# Altium footprint library RPSLib.PcbLib: 199 footprints (part 9 of 13)
Each footprint in its own frame and in the unit in brackets; x right, y up, seen from the top. Pads: shape width x height; smd on the part's side, far side on the other; paste and mask are expansions set on the pad; w line width, h text height; cw(c..) or ccw(c..) is an arc to the next point about the centre after c.
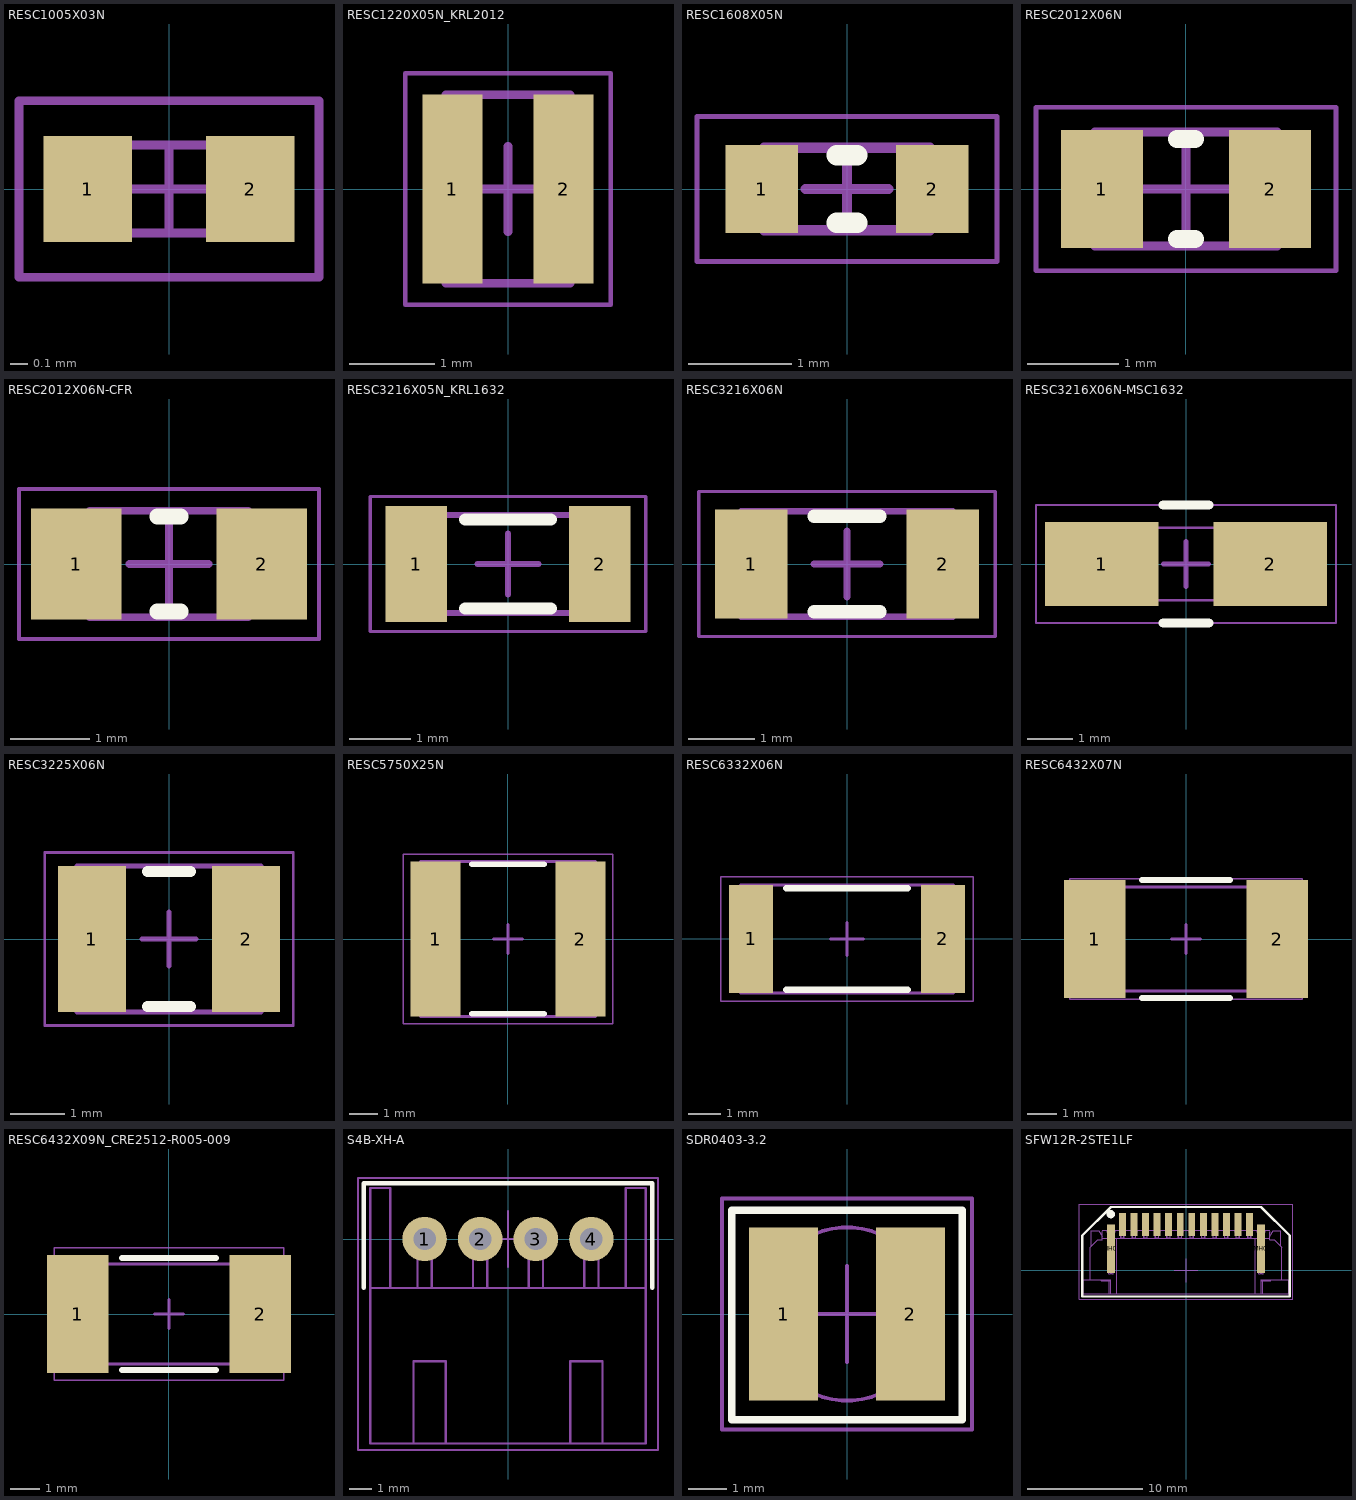
[diagram p8: the footprints below, top view; thin cyan lines are the x and y axes]

## RESC1005X03N [mm] "Chip Resistor, 2-Leads, Body 1.00x0.50mm, IPC Medium Density"
height 0.35
pads (2):
  rect 0.5x0.6 smd paste-0.03 mask+0.07: 1(-0.46,0) 2(0.46,0)
Mechanical 13:
  lines w0.05: -0.5,-0.25 -0.5,0.25 0.5,0.25 0.5,-0.25 -0.5,-0.25
Mechanical 15:
  lines w0.05: -0.25,0 0.25,0 ; 0,-0.25 0,0.25 ; -0.85,-0.5 -0.85,0.5 0.85,0.5 0.85,-0.5 -0.85,-0.5
3D body "RESC1005X03L.step": height 0.35, standoff 0, extent -0.5,-0.25 0.5,0.25

## RESC1220X05N_KRL2012 [mm] "Chip Resistor, 2-Leads, Body 1.25x2.00mm, IPC Medium Density"
height 0.5
pads (2):
  rect 0.7x2.2 smd mask+0.07: 1(-0.65,0) 2(0.65,0)
Mechanical 13:
  lines w0.1: -0.725,-1.1 0.725,-1.1 0.725,1.1 -0.725,1.1 -0.725,-1.1
Mechanical 15:
  lines w0.05: -1.2,-1.35 1.2,-1.35 1.2,1.35 -1.2,1.35 -1.2,-1.35
  lines w0.1: -0.5,0 0.5,0 ; 0,-0.5 0,0.5
3D body "RESC1220X05N.step": height 0.5, standoff 0, extent -0.725,-1.1 0.725,1.1

## RESC1608X05N [mm] "Chip Resistor, 2-Leads, Body 1.60x0.80mm, IPC Medium Density"
height 0.45
pads (2):
  rect 0.7x0.85 smd paste-0.05: 1(-0.825,0) 2(0.825,0)
Top Overlay:
  lines w0.2: -0.1,-0.325 0.1,-0.325 ; -0.1,0.325 0.1,0.325
Mechanical 13:
  lines w0.1: -0.8,-0.4 0.8,-0.4 0.8,0.4 -0.8,0.4 -0.8,-0.4
Mechanical 15:
  lines w0.05: -1.45,-0.7 1.45,-0.7 1.45,0.7 -1.45,0.7 -1.45,-0.7
  lines w0.1: -0.4,0 0.4,0 ; 0,-0.4 0,0.4
3D body "RESC1608X05N.step": height 0.45, standoff 0, extent -0.8,-0.4 0.8,0.4

## RESC2012X06N [mm] "Chip Resistor, 2-Leads, Body 2.00x1.25mm, IPC Medium Density"
height 0.6
pads (2):
  rect 0.9x1.3 smd paste-0.05 mask+0.07: 1(-0.925,0) 2(0.925,0)
Top Overlay:
  lines w0.2: -0.1,-0.55 0.1,-0.55 ; -0.1,0.55 0.1,0.55
Mechanical 13:
  lines w0.1: -1,-0.625 1,-0.625 1,0.625 -1,0.625 -1,-0.625
Mechanical 15:
  lines w0.05: -1.65,-0.9 1.65,-0.9 1.65,0.9 -1.65,0.9 -1.65,-0.9
  lines w0.1: -0.5,0 0.5,0 ; 0,-0.5 0,0.5
3D body "RESC2012X06N.step": height 0.6, standoff 0, extent -1,-0.625 1,0.625

## RESC2012X06N-CFR [mm] "Chip Resistor, 2-Leads, Body 1.95x1.25mm, IPC Medium Density"
height 0.6
pads (2):
  rect 1.15x1.4 smd mask+0.07: 1(-1.175,0) 2(1.175,0)
Top Overlay:
  lines w0.2: -0.15,-0.6 0.15,-0.6 ; -0.15,0.6 0.15,0.6
Mechanical 13:
  lines w0.1: -1,-0.675 1,-0.675 1,0.675 -1,0.675 -1,-0.675
Mechanical 15:
  lines w0.05: -1.9,-0.95 1.9,-0.95 1.9,0.95 -1.9,0.95 -1.9,-0.95
  lines w0.1: -0.5,0 0.5,0 ; 0,-0.5 0,0.5
3D body "RESC2012X06N-CFR.step": height 0.6, standoff 0, extent -1,-0.675 1,0.675

## RESC3216X05N_KRL1632 [mm] "Chip Resistor, 2-Leads, Body 3.20x1.60mm, IPC Medium Density"
height 0.5
pads (2):
  rect 1x1.9 smd: 1(-1.5,0) 2(1.5,0)
Top Overlay:
  lines w0.2: -0.7,-0.725 0.7,-0.725 ; -0.7,0.725 0.7,0.725
Mechanical 13:
  lines w0.1: -1.6,-0.8 -1.6,0.8 1.6,0.8 1.6,-0.8 -1.6,-0.8
Mechanical 15:
  lines w0.05: -2.25,-1.1 -2.25,1.1 2.25,1.1 2.25,-1.1 -2.25,-1.1
  lines w0.1: -0.5,0 0.5,0 ; 0,-0.5 0,0.5
3D body "RESC3216X05N.step": height 0.5, standoff 0, extent -1.6,-0.8 1.6,0.8

## RESC3216X06N [mm] "Chip Resistor, 2-Leads, Body 3.20x1.60mm, IPC Medium Density"
height 0.6
pads (2):
  rect 1.1x1.65 smd: 1(-1.45,0) 2(1.45,0)
Top Overlay:
  lines w0.2: -0.5,-0.725 0.5,-0.725 ; -0.5,0.725 0.5,0.725
Mechanical 13:
  lines w0.1: -1.6,-0.8 -1.6,0.8 1.6,0.8 1.6,-0.8 -1.6,-0.8
Mechanical 15:
  lines w0.05: -2.25,-1.1 -2.25,1.1 2.25,1.1 2.25,-1.1 -2.25,-1.1
  lines w0.1: -0.5,0 0.5,0 ; 0,-0.5 0,0.5
3D body "RESC3216X06N.step": height 0.6, standoff 0, extent -1.6,-0.8 1.6,0.8

## RESC3216X06N-MSC1632 [mm] "Chip Resistor, 2-Leads, Body 3.20x1.60mm, IPC Medium Density"
height 0.6
pads (2):
  rect 2.5x1.84 smd paste-0.05 mask+0.03: 1(-1.85,0) 2(1.85,0)
Top Overlay:
  lines w0.2: -0.5,-1.3 0.5,-1.3 ; -0.5,1.3 0.5,1.3
Mechanical 13:
  lines w0.05: -1.6,-0.8 -1.6,0.8 1.6,0.8 1.6,-0.8 -1.6,-0.8
Mechanical 15:
  lines w0.05: -3.3,-1.3 3.3,-1.3 3.3,1.3 -3.3,1.3 -3.3,-1.3
  lines w0.1: -0.5,0 0.5,0 ; 0,-0.5 0,0.5
3D body "Resistor MCS.stp": height 0.6, standoff 0, extent -1.6,-0.8 1.6,0.8

## RESC3225X06N [mm] "Chip Resistor, 2-Leads, Body 3.20x2.50mm, IPC Medium Density"
height 0.6
pads (2):
  rect 1.25x2.7 smd: 1(-1.425,0) 2(1.425,0)
Top Overlay:
  lines w0.2: -0.4,-1.25 0.4,-1.25 ; -0.4,1.25 0.4,1.25
Mechanical 13:
  lines w0.1: -1.7,-1.35 -1.7,1.35 1.7,1.35 1.7,-1.35 -1.7,-1.35
Mechanical 15:
  lines w0.05: -2.3,-1.6 -2.3,1.6 2.3,1.6 2.3,-1.6 -2.3,-1.6
  lines w0.1: -0.5,0 0.5,0 ; 0,-0.5 0,0.5
3D body "RESC3225X06N.step": height 0.6, standoff 0, extent -1.7,-1.35 1.7,1.35

## RESC5750X25N [mm] "Chip Resistor, 2-Leads, Body 5.70x5.00mm, IPC Medium Density"
height 2.5
pads (2):
  rect 1.75x5.4 smd paste-0.07 mask+0.07: 1(-2.525,0) 2(2.525,0)
Top Overlay:
  lines w0.2: -1.25,-2.6 1.25,-2.6 ; -1.25,2.6 1.25,2.6
Mechanical 13:
  lines w0.1: -3.05,-2.7 -3.05,2.7 3.05,2.7 3.05,-2.7 -3.05,-2.7
Mechanical 15:
  lines w0.05: -3.65,-2.95 -3.65,2.95 3.65,2.95 3.65,-2.95 -3.65,-2.95
  lines w0.1: -0.5,0 0.5,0 ; 0,-0.5 0,0.5
3D body "RESC5750X25N.step": height 2.5, standoff 0, extent -3.05,-2.7 3.05,2.7

## RESC6332X06N [mm] "Chip Resistor, 2-Leads, Body 6.30x3.20mm, IPC Medium Density"
height 0.6
pads (2):
  rect 1.35x3.3 smd: 1(-2.925,0) 2(2.925,0)
Top Overlay:
  lines w0.2: -1.85,-1.55 1.85,-1.55 ; -1.85,1.55 1.85,1.55
Mechanical 13:
  lines w0.1: -3.25,-1.65 3.25,-1.65 3.25,1.65 -3.25,1.65 -3.25,-1.65
Mechanical 15:
  lines w0.05: -3.85,-1.9 3.85,-1.9 3.85,1.9 -3.85,1.9 -3.85,-1.9
  lines w0.1: -0.5,0 0.5,0 ; 0,-0.5 0,0.5
3D body "RESC6332X06N.step": height 0.6, standoff 0, extent -3.25,-1.65 3.25,1.65

## RESC6432X07N [mm] "Chip Resistor, 2-Leads, Body 6.4x3.2mm, IPC Medium Density"
height 0.7
pads (2):
  rect 2.1x4 smd: 1(-3.1,0) 2(3.1,0)
Top Overlay:
  lines w0.2: -1.5,-2 1.5,-2 ; -1.5,2 1.5,2
Mechanical 13:
  lines w0.1: -3.325,-1.775 3.325,-1.775 3.325,1.775 -3.325,1.775 -3.325,-1.775
Mechanical 15:
  lines w0.05: -3.95,-2.05 3.95,-2.05 3.95,2.05 -3.95,2.05 -3.95,-2.05
  lines w0.1: -0.5,0 0.5,0 ; 0,-0.5 0,0.5
3D body "RESC6533X07N.step": height 0.7, standoff 0, extent -3.325,-1.775 3.325,1.775

## RESC6432X09N_CRE2512-R005-009 [mm] "Chip Resistor, 2-Leads, Body 6,40x3,20mm, IPC Medium Density"
height 0.9
pads (2):
  rect 2.1x4 smd: 1(-3.1,0) 2(3.1,0)
Top Overlay:
  lines w0.2: -1.6,-1.9 1.6,-1.9 ; -1.6,1.9 1.6,1.9
Mechanical 13:
  lines w0.1: -3.3,-1.7 3.3,-1.7 3.3,1.7 -3.3,1.7 -3.3,-1.7
Mechanical 15:
  lines w0.05: -3.9,-2.25 3.9,-2.25 3.9,2.25 -3.9,2.25 -3.9,-2.25
  lines w0.1: -0.5,0 0.5,0 ; 0,-0.5 0,0.5
3D body "RESC6432X09N.step": height 0.9, standoff 0, extent -3.3,-1.7 3.3,1.7

## S4B-XH-A [mm]
pads (4):
  round 2 hole 1 mask+0.07: 1(-3.75,0) 2(-1.25,0) 3(1.25,0) 4(3.75,0)
Top Overlay:
  lines w0.2: -6.5,-2.2 -6.5,2.5 6.5,2.5 6.5,-2.2
Mechanical 13:
  lines w0.1: -5.3,-2.2 -5.3,2.3 -6.2,2.3 -6.2,-2.2 ; -4.07,-2.2 -4.07,-0.92 -4.07,0.32 -3.43,0.32 -3.43,-0.92 -3.43,-2.2 ; -1.57,-2.2 -1.57,-0.92 -1.57,0.32 -0.93,0.32 -0.93,-0.92 -0.93,-2.2 ; 0.93,-2.2 0.93,-0.92 0.93,0.32 1.57,0.32 1.57,-0.92 1.57,-2.2 ; 3.43,-2.2 3.43,-0.92 3.43,0.32 4.07,0.32 4.07,-0.92 4.07,-2.2 ; 5.3,-2.2 5.3,2.3 6.2,2.3 6.2,-2.2 ; -6.2,-2.2 6.2,-2.2 ; -6.2,-2.2 -6.2,-9.2 -4.25,-9.2 ; -4.25,-9.2 -2.8,-9.2 ; -4.25,-9.2 -4.25,-5.5 -2.8,-5.5 -2.8,-9.2 ; -2.8,-9.2 2.8,-9.2 ; 2.8,-9.2 4.25,-9.2 ; 2.8,-9.2 2.8,-5.5 4.25,-5.5 4.25,-9.2 ; 4.25,-9.2 6.2,-9.2 6.2,-2.2
Mechanical 15:
  lines w0.1: -1.25,0 1.25,0 ; 0,-1.25 0,1.25 ; -6.75,-9.5 -6.75,2.75 6.75,2.75 6.75,-9.5 -6.75,-9.5
3D body "S4B-XH-A_norm.stp": height 6.15, standoff -3.4, extent -6.2,-9.2 6.2,2.3

## SDR0403-3.2 [mm] "Bourns SDR0403 Inductor"
height 3.5
pads (2):
  rect 1.8x4.5 smd mask+0.07: 1(-1.65,0) 2(1.65,0)
Top Overlay:
  lines w0.2: -3,-2.75 -3,2.7 3,2.7 3,-2.75 -3,-2.75
Mechanical 13:
  circle w0.1: c0,0 r2.25
Mechanical 15:
  lines w0.1: -1.25,0 1.25,0 ; 0,-1.25 0,1.25 ; -3.25,-3 3.25,-3 3.25,3 -3.25,3 -3.25,-3
3D body "sdr0403.stp": height 3.2, standoff 0, extent -2.25,-2.25 2.25,2.25

## SFW12R-2STE1LF [mm]
height 2.7
pads (14):
  rect 0.6x2 smd mask+0.07: 1(-5.5,4) 2(-4.5,4) 3(-3.5,4) 4(-2.5,4) 5(-1.5,4) 6(-0.5,4) 7(0.5,4) 8(1.5,4) 9(2.5,4) 10(3.5,4) 11(4.5,4) 12(5.5,4)
  rect 0.7x4.2 smd mask+0.07: MH0(-6.5,1.9) MH0(6.5,1.9)
Top Overlay:
  circle w0.35: c-6.518,4.88 r0.18
  lines w0.2: -9,-2.25 9,-2.25 9,3 6.5,5.5 -6.5,5.5 -9,3 -9,-2.25
Mechanical 13:
  drawing of 1279 lines, arcs and shapes, not listed
Mechanical 15:
  lines w0.1: -1,0 1,0 ; 0,-1 0,1 ; -9.25,-2.5 -9.25,5.75 9.25,5.75 9.25,-2.5 -9.25,-2.5
3D body "SFW12R-2STE1LF_norm.stp": height 2.7, standoff 0, extent -8.9,-2 8.9,4.5